# Altium footprint library DIOT_temperature_logger.PcbLib: 100 footprints (part 3 of 7)
Each footprint in its own frame and in the unit in brackets; x right, y up, seen from the top. Pads: shape width x height; smd on the part's side, far side on the other; paste and mask are expansions set on the pad; w line width, h text height; cw(c..) or ccw(c..) is an arc to the next point about the centre after c.
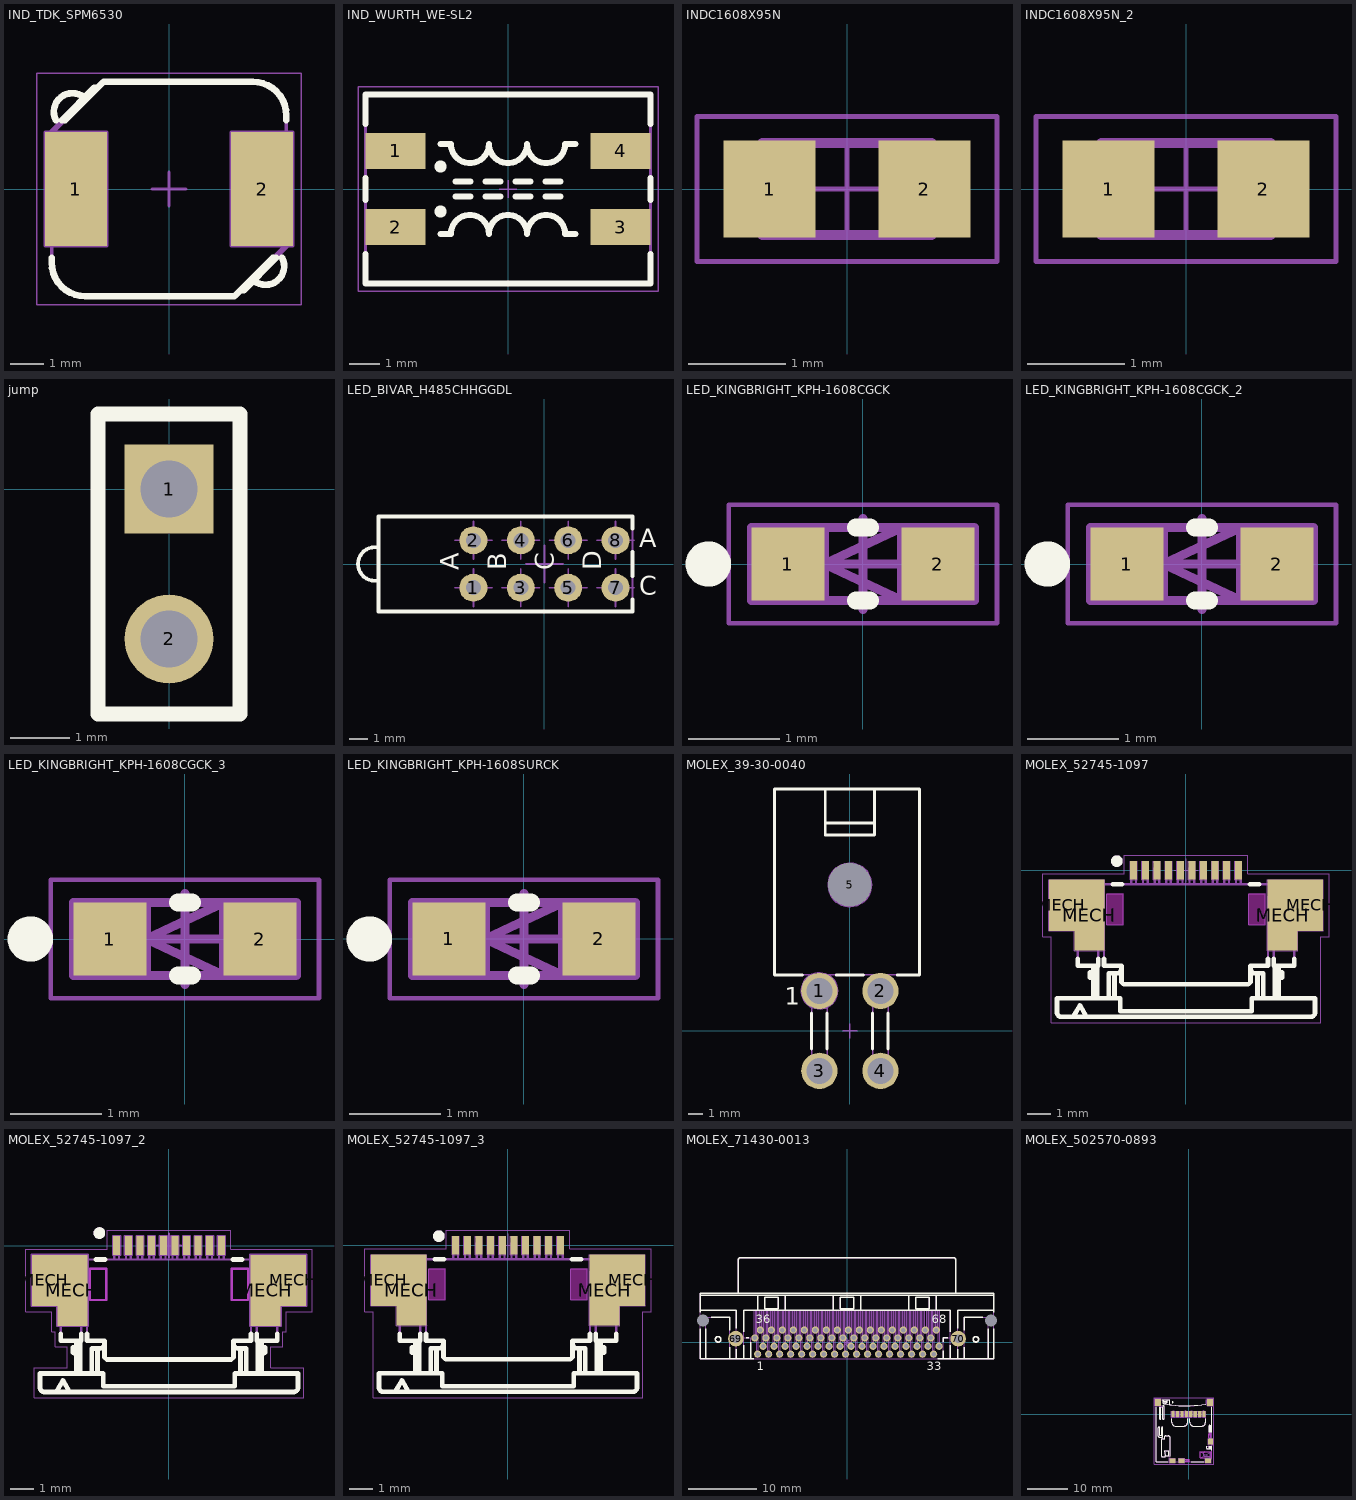
[diagram p2: the footprints below, top view; thin cyan lines are the x and y axes]

## IND_TDK_SPM6530 [mm]
pads (2):
  rect 1.85x3.4 smd: 1(-2.775,0) 2(2.775,0)
Top Overlay:
  lines w0.2: -3.5,-2.05 -3.5,-2.2 ccw(c-2.5,-2.2) -2.5,-3.2 1.95,-3.2 3.1,-2.05 ; -3.373,2.05 cw(c-2.883,2.307) -2.532,2.733 -2.524,2.726 ; -3.2,2.05 -2.227,3.023 -2.127,3.023 ; -3.1,2.05 -1.95,3.2 2.5,3.2 cw(c2.5,2.2) 3.5,2.2 3.5,2.05 ; 2.127,-3.023 2.227,-3.023 3.2,-2.05 ; 2.524,-2.726 2.532,-2.733 ccw(c2.883,-2.307) 3.373,-2.05
Mechanical 8:
  lines w0.1: -3.275,0 -2.775,0 ; -2.775,-0.5 -2.775,0 ; -2.775,0.5 -2.775,0 ; -2.275,0 -2.775,0 ; -0.5,0 0,0 ; 0,-0.5 0,0 ; 0,0.5 0,0 ; 0.5,0 0,0 ; 2.275,0 2.775,0 ; 2.775,-0.5 2.775,0 ; 2.775,0.5 2.775,0 ; 3.275,0 2.775,0 ; -3.7,-1.7 -3.7,1.7 -1.85,1.7 -1.85,-1.7 -3.7,-1.7 ; 1.85,-1.7 3.7,-1.7 3.7,1.7 1.85,1.7 1.85,-1.7
Mechanical 14:
  lines w0.1: -3.5,-1.6 -3.6,-1.6 -3.6,1.65 ; -3.302,1.948 -3.309,1.955 cw(c-2.883,2.307) -2.532,2.733 -2.524,2.726 ; -2.127,3.023 -2.227,3.023 -3.6,1.65 ; 2.127,-3.023 2.227,-3.023 3.6,-1.65 ; 2.524,-2.726 2.532,-2.733 ccw(c2.883,-2.307) 3.309,-1.955 3.302,-1.948 ; 3.5,1.6 3.6,1.6 3.6,-1.65 ; -3.6,1.65 -3.5,1.65 ; -3.5,1.65 -1.95,3.2 2.5,3.2 cw(c2.5,2.2) 3.5,2.2 3.5,0.9 2.564,0.9 2.564,1 ccw(c2.295,1) 2.025,1 2.025,-1 ccw(c2.295,-1) 2.564,-1 2.564,-0.9 3.5,-0.9 3.5,-1.65 ; -3.5,1.65 -3.5,0.9 -2.564,0.9 -2.564,1 cw(c-2.295,1) -2.025,1 -2.025,-1 cw(c-2.295,-1) -2.564,-1 -2.564,-0.9 -3.5,-0.9 -3.5,-2.2 ccw(c-2.5,-2.2) -2.5,-3.2 1.95,-3.2 3.5,-1.65 ; 3.5,-1.65 3.6,-1.65
Mechanical 15:
  lines w0.05: -3.95,-3.45 3.95,-3.45 3.95,3.45 -3.95,3.45 -3.95,-3.45
3D body "IND_TDK_SPM6530.stp": height 3.1, standoff 0, extent -3.6,-3.2 3.6,3.2

## IND_WURTH_WE-SL2 [mm]
pads (4):
  rect 2x1.2 smd: 1(-3.75,1.27) 2(-3.75,-1.27) 3(3.75,-1.27) 4(3.75,1.27)
Top Overlay:
  circle w0.2: c-2.25,0.75 r0.1
  circle w0.2: c-2.25,-0.75 r0.1
  lines w0.2: -4.75,-2.175 -4.75,-3.15 4.75,-3.15 4.75,-2.175 ; -4.75,-0.365 -4.75,0.365 ; -4.75,2.175 -4.75,3.15 4.75,3.15 4.75,2.175 ; -2.25,-1.5 -1.905,-1.5 cw(c-1.27,-1.5) -0.635,-1.5 cw(c0,-1.5) 0.635,-1.5 cw(c1.27,-1.5) 1.905,-1.5 2.25,-1.5 ; -2.25,1.5 -1.905,1.5 ccw(c-1.27,1.5) -0.635,1.5 ccw(c0,1.5) 0.635,1.5 ccw(c1.27,1.5) 1.905,1.5 2.25,1.5 ; -1.75,-0.25 -1.25,-0.25 ; -1.75,0.25 -1.25,0.25 ; -0.75,-0.25 -0.25,-0.25 ; -0.75,0.25 -0.25,0.25 ; 0.25,-0.25 0.75,-0.25 ; 0.25,0.25 0.75,0.25 ; 1.25,-0.25 1.75,-0.25 ; 1.25,0.25 1.75,0.25 ; 4.75,-0.365 4.75,0.365
Mechanical 8:
  lines w0.05: -0.3,0 0.3,0 ; 0,-0.3 0,0.3
Mechanical 14:
  circle w0.1: c-2.25,0.75 r0.1
  circle w0.1: c-2.25,-0.75 r0.1
  lines w0.1: -2.25,-1.5 -1.905,-1.5 cw(c-1.27,-1.5) -0.635,-1.5 cw(c0,-1.5) 0.635,-1.5 cw(c1.27,-1.5) 1.905,-1.5 2.25,-1.5 ; -2.25,1.5 -1.905,1.5 ccw(c-1.27,1.5) -0.635,1.5 ccw(c0,1.5) 0.635,1.5 ccw(c1.27,1.5) 1.905,1.5 2.25,1.5 ; -1.75,-0.25 -1.25,-0.25 ; -1.75,0.25 -1.25,0.25 ; -0.75,-0.25 -0.25,-0.25 ; -0.75,0.25 -0.25,0.25 ; 0.25,-0.25 0.75,-0.25 ; 0.25,0.25 0.75,0.25 ; 1.25,-0.25 1.75,-0.25 ; 1.25,0.25 1.75,0.25 ; -4.75,-3.15 4.75,-3.15 4.75,3.15 -4.75,3.15 -4.75,-3.15
Mechanical 15:
  lines w0.05: -5,-3.4 5,-3.4 5,3.4 -5,3.4 -5,-3.4
3D body "IND_WURTH_WE-SL2.stp": height 5.3, standoff 0, extent -4.749,-3.149 4.751,3.151

## INDC1608X95N [mm]
pads (2):
  rect 0.95x1 smd: 1(-0.8,0) 2(0.8,0)
Mechanical 14:
  lines w0.1: -0.875,-0.475 -0.875,0.475 0.875,0.475 0.875,-0.475 -0.875,-0.475
Mechanical 15:
  lines w0.05: -0.5,0 0.5,0 ; 0,-0.5 0,0.5 ; -1.55,-0.75 -1.55,0.75 1.55,0.75 1.55,-0.75 -1.55,-0.75
3D body "INDC1608X95N.stp": height 0.95, standoff -0.05, extent -0.875,-0.475 0.875,0.475

## INDC1608X95N_2 [mm]
pads (2):
  rect 0.95x1 smd: 1(-0.8,0) 2(0.8,0)
Mechanical 14:
  lines w0.1: -0.875,-0.475 -0.875,0.475 0.875,0.475 0.875,-0.475 -0.875,-0.475
Mechanical 15:
  lines w0.05: -0.5,0 0.5,0 ; 0,-0.5 0,0.5 ; -1.55,-0.75 -1.55,0.75 1.55,0.75 1.55,-0.75 -1.55,-0.75
3D body "INDC1608X95N.stp": height 0.95, standoff -0.05, extent -0.875,-0.475 0.875,0.475

## jump [mm]
pads (2):
  rect 1.5x1.5 hole 0.965: 1(0,0)
  round 1.5 hole 0.965: 2(0,-2.54)
Top Overlay:
  lines w0.254: -1.2,-3.81 -1.2,1.27 1.2,1.27 1.2,-3.81 -1.2,-3.81
3D body "COMATEL_385.0358.1.02.400.stp": height 8, standoff -3.2, extent -1.256,-3.835 1.194,1.245

## LED_BIVAR_H485CHHGGDL [mm]
pads (8):
  round 1.5 hole 0.8: 1(-3.81,-1.27) 2(-3.81,1.27) 3(-1.27,-1.27) 4(-1.27,1.27) 5(1.27,-1.27) 6(1.27,1.27) 7(3.81,-1.27) 8(3.81,1.27)
Top Overlay:
  lines w0.2: -8.89,-0.9 -9.09,-0.9 cw(c-9.09,0) -9.09,0.9 -8.89,0.9 ; 4.71,-1.902 4.71,-2.55 -8.89,-2.55 -8.89,2.55 4.71,2.55 4.71,1.902 ; 4.71,-0.638 4.71,0.638
  text "A" at -4.591,-0.331 h1
  text "B" at -2.051,-0.331 h1
  text "C" at 0.489,-0.331 h1
  text "D" at 3.029,-0.331 h1
  text "A" at 5.08,0.889 h1
  text "C" at 5.08,-1.651 h1
Mechanical 8:
  lines w0.1: -4.81,-1.27 -3.81,-1.27 ; -4.81,1.27 -3.81,1.27 ; -3.81,-2.27 -3.81,-1.27 ; -3.81,-0.27 -3.81,-1.27 ; -3.81,0.27 -3.81,1.27 ; -3.81,2.27 -3.81,1.27 ; -2.81,-1.27 -3.81,-1.27 ; -2.81,1.27 -3.81,1.27 ; -2.27,-1.27 -1.27,-1.27 ; -2.27,1.27 -1.27,1.27 ; -1.27,-2.27 -1.27,-1.27 ; -1.27,-0.27 -1.27,-1.27 ; -1.27,0.27 -1.27,1.27 ; -1.27,2.27 -1.27,1.27 ; -1,0 0,0 ; -0.27,-1.27 -1.27,-1.27 ; -0.27,1.27 -1.27,1.27 ; 0,-1 0,0 ; 0,1 0,0 ; 0.27,-1.27 1.27,-1.27 ; 0.27,1.27 1.27,1.27 ; 1,0 0,0 ; 1.27,-2.27 1.27,-1.27 ; 1.27,-0.27 1.27,-1.27 ; 1.27,0.27 1.27,1.27 ; 1.27,2.27 1.27,1.27 ; 2.27,-1.27 1.27,-1.27 ; 2.27,1.27 1.27,1.27 ; 2.81,-1.27 3.81,-1.27 ; 2.81,1.27 3.81,1.27 ; 3.81,-2.27 3.81,-1.27 ; 3.81,-0.27 3.81,-1.27 ; 3.81,0.27 3.81,1.27 ; 3.81,2.27 3.81,1.27 ; 4.81,-1.27 3.81,-1.27 ; 4.81,1.27 3.81,1.27
Mechanical 14:
  lines w0.1: -8.89,-0.9 -9.09,-0.9 cw(c-9.09,0) -9.09,0.9 -8.89,0.9 ; -8.89,-2.55 -8.89,2.55 4.71,2.55 4.71,-2.55 -8.89,-2.55
  text "A" at -4.591,-0.331 h1
  text "B" at -2.051,-0.331 h1
  text "C" at 0.489,-0.331 h1
  text "D" at 3.029,-0.331 h1
  text "C" at 5.08,-1.651 h1
  text "A" at 5.08,0.889 h1
3D body "LED_BIVAR_H485CHHGGDL.stp": height 11.3, standoff -3.2, extent -9.99,-2.55 4.71,2.55

## LED_KINGBRIGHT_KPH-1608CGCK [mm]
pads (2):
  rect 0.8x0.8 smd: 1(-0.825,0) 2(0.825,0)
Top Overlay:
  circle w0.25: c-1.7,0 r0.125
  lines w0.2: -0.075,-0.4 0.075,-0.4 ; -0.075,0.4 0.075,0.4
Mechanical 8:
  lines w0.1: -0.5,0 0,0 ; -0.425,0 0.425,0 ; 0,-0.5 0,0 ; 0,0.5 0,0 ; 0.5,0 0,0 ; -0.425,-0.4 -1.225,-0.4 -1.225,0.4 -0.425,0.4 ; -0.425,-0.4 -0.425,0.4 ; -0.425,-0.4 -0.825,0 -0.425,0.4 ; 1.225,-0.4 0.425,-0.4 0.425,0.4 1.225,0.4 ; 1.225,-0.4 1.225,0.4 ; 1.225,-0.4 0.825,0 1.225,0.4
Mechanical 14:
  lines w0.1: -0.8,-0.4 -0.8,0.4 0.8,0.4 0.8,-0.4 -0.8,-0.4 ; -0.425,0 0.425,0.4 0.425,-0.4 -0.425,0
Mechanical 15:
  lines w0.05: -1.475,-0.65 -1.475,0.65 1.475,0.65 1.475,-0.65 -1.475,-0.65
3D body "LED_KINGBRIGHT_KPH-1608CGCK_Part1.stp": height 0.2, standoff 0, extent -0.8,-0.4 0.8,0.4
3D body "LED_KINGBRIGHT_KPH-1608CGCK_Part2.stp": height 0.65, standoff 0.12, extent -0.6,-0.4 0.6,0.4

## LED_KINGBRIGHT_KPH-1608CGCK_2 [mm]
pads (2):
  rect 0.8x0.8 smd: 1(-0.825,0) 2(0.825,0)
Top Overlay:
  circle w0.25: c-1.7,0 r0.125
  lines w0.2: -0.075,-0.4 0.075,-0.4 ; -0.075,0.4 0.075,0.4
Mechanical 8:
  lines w0.1: -0.5,0 0,0 ; -0.425,0 0.425,0 ; 0,-0.5 0,0 ; 0,0.5 0,0 ; 0.5,0 0,0 ; -0.425,-0.4 -0.825,0 -0.425,0.4 ; -0.425,-0.4 -0.425,0.4 ; -0.425,-0.4 -1.225,-0.4 -1.225,0.4 -0.425,0.4 ; 1.225,-0.4 0.825,0 1.225,0.4 ; 1.225,-0.4 1.225,0.4 ; 1.225,-0.4 0.425,-0.4 0.425,0.4 1.225,0.4
Mechanical 14:
  lines w0.1: -0.8,-0.4 0.8,-0.4 0.8,0.4 -0.8,0.4 -0.8,-0.4 ; -0.425,0 0.425,-0.4 0.425,0.4 -0.425,0
Mechanical 15:
  lines w0.05: -1.475,-0.65 1.475,-0.65 1.475,0.65 -1.475,0.65 -1.475,-0.65
3D body "LED_KINGBRIGHT_KPH-1608CGCK_Part2.stp": height 0.65, standoff 0.12, extent -0.6,-0.4 0.6,0.4
3D body "LED_KINGBRIGHT_KPH-1608CGCK_Part1.stp": height 0.2, standoff 0, extent -0.8,-0.4 0.8,0.4

## LED_KINGBRIGHT_KPH-1608CGCK_3 [mm]
pads (2):
  rect 0.8x0.8 smd: 1(-0.825,0) 2(0.825,0)
Top Overlay:
  circle w0.25: c-1.7,0 r0.125
  lines w0.2: -0.075,-0.4 0.075,-0.4 ; -0.075,0.4 0.075,0.4
Mechanical 8:
  lines w0.1: -0.5,0 0,0 ; -0.425,0 0.425,0 ; 0,-0.5 0,0 ; 0,0.5 0,0 ; 0.5,0 0,0 ; -0.425,-0.4 -1.225,-0.4 -1.225,0.4 -0.425,0.4 ; -0.425,-0.4 -0.425,0.4 ; -0.425,-0.4 -0.825,0 -0.425,0.4 ; 1.225,-0.4 0.425,-0.4 0.425,0.4 1.225,0.4 ; 1.225,-0.4 1.225,0.4 ; 1.225,-0.4 0.825,0 1.225,0.4
Mechanical 14:
  lines w0.1: -0.8,-0.4 -0.8,0.4 0.8,0.4 0.8,-0.4 -0.8,-0.4 ; -0.425,0 0.425,0.4 0.425,-0.4 -0.425,0
Mechanical 15:
  lines w0.05: -1.475,-0.65 -1.475,0.65 1.475,0.65 1.475,-0.65 -1.475,-0.65
3D body "LED_KINGBRIGHT_KPH-1608CGCK_Part1.stp": height 0.2, standoff 0, extent -0.8,-0.4 0.8,0.4
3D body "LED_KINGBRIGHT_KPH-1608CGCK_Part2.stp": height 0.65, standoff 0.12, extent -0.6,-0.4 0.6,0.4

## LED_KINGBRIGHT_KPH-1608SURCK [mm]
pads (2):
  rect 0.8x0.8 smd: 1(-0.825,0) 2(0.825,0)
Top Overlay:
  circle w0.25: c-1.7,0 r0.125
  lines w0.2: -0.075,-0.4 0.075,-0.4 ; -0.075,0.4 0.075,0.4
Mechanical 8:
  lines w0.1: -0.5,0 0,0 ; -0.425,0 0.425,0 ; 0,-0.5 0,0 ; 0,0.5 0,0 ; 0.5,0 0,0 ; -0.425,-0.4 -1.225,-0.4 -1.225,0.4 -0.425,0.4 ; -0.425,-0.4 -0.425,0.4 ; -0.425,-0.4 -0.825,0 -0.425,0.4 ; 1.225,-0.4 0.425,-0.4 0.425,0.4 1.225,0.4 ; 1.225,-0.4 1.225,0.4 ; 1.225,-0.4 0.825,0 1.225,0.4
Mechanical 14:
  lines w0.1: -0.8,-0.4 -0.8,0.4 0.8,0.4 0.8,-0.4 -0.8,-0.4 ; -0.425,0 0.425,0.4 0.425,-0.4 -0.425,0
Mechanical 15:
  lines w0.05: -1.475,-0.65 -1.475,0.65 1.475,0.65 1.475,-0.65 -1.475,-0.65
3D body "LED_KINGBRIGHT_KPH-1608SURCK_Part2.stp": height 0.65, standoff 0.12, extent -0.6,-0.4 0.6,0.4
3D body "LED_KINGBRIGHT_KPH-1608SURCK_Part1.stp": height 0.2, standoff 0, extent -0.8,-0.4 0.8,0.4

## MOLEX_39-30-0040 [mm]
pads (5):
  round 2.5 hole 1.8: 1(-2.1,2.75) 2(2.1,2.75) 3(-2.1,-2.75) 4(2.1,-2.75)
  round 1 hole 3 unplated mask+1: 5(0,10.05)
Top Overlay:
  lines w0.2: -3.262,3.85 -5.2,3.85 -5.2,16.65 4.8,16.65 4.8,3.85 3.262,3.85 ; -2.635,-1.242 -2.635,1.242 ; -1.7,14.3 1.7,14.3 ; -1.7,16.65 -1.7,13.478 1.7,13.478 1.7,16.65 ; -1.565,-1.242 -1.565,1.242 ; -0.938,3.85 0.938,3.85 ; 1.565,-1.242 1.565,1.242 ; 2.635,-1.242 2.635,1.242
  text "1" at -4.475,1.8 h1.2
Mechanical 8:
  circle w0.1: c0,10.05 r1.5
  circle w0.1: c-2.1,2.75 r0.9
  circle w0.1: c-2.1,2.75 r1.25
  lines w0.1: -2.6,-2.75 -2.1,-2.75 ; -2.6,2.75 -2.1,2.75 ; -2.1,-3.25 -2.1,-2.75 ; -2.1,-2.25 -2.1,-2.75 ; -2.1,2.25 -2.1,2.75 ; -2.1,3.25 -2.1,2.75 ; -1.6,-2.75 -2.1,-2.75 ; -1.6,2.75 -2.1,2.75 ; -0.5,0 0,0 ; -0.5,10.05 0,10.05 ; 0,-0.5 0,0 ; 0,0.5 0,0 ; 0,9.55 0,10.05 ; 0,10.55 0,10.05 ; 0.5,0 0,0 ; 0.5,10.05 0,10.05 ; 1.6,-2.75 2.1,-2.75 ; 1.6,2.75 2.1,2.75 ; 2.1,-3.25 2.1,-2.75 ; 2.1,-2.25 2.1,-2.75 ; 2.1,2.25 2.1,2.75 ; 2.1,3.25 2.1,2.75 ; 2.6,-2.75 2.1,-2.75 ; 2.6,2.75 2.1,2.75
Mechanical 14:
  lines w0.1: -2.635,3.85 -2.635,-3.285 -1.565,-3.285 -1.565,3.85 ; -1.7,14.3 1.7,14.3 ; -1.7,16.65 -1.7,13.478 1.7,13.478 1.7,16.65 ; 1.565,3.85 1.565,-3.285 2.635,-3.285 2.635,3.85 ; -5.2,3.85 4.8,3.85 4.8,16.65 -5.2,16.65 -5.2,3.85
  text "1" at -4.475,1.8 h1.2
3D body "MOLEX_39-30-0040.stp": height 11.4, standoff -3.6, extent -5.2,-3.285 4.8,16.65

## MOLEX_52745-1097 [mm]
pads (14):
  rect 0.3x0.8 smd: 1(-2.25,0) 2(-1.75,0) 3(-1.25,0) 4(-0.75,0) 5(-0.24,0) 6(0.25,0) 7(0.75,0) 8(1.25,0) 9(1.75,0) 10(2.25,0)
  rect 1.1x2.2 smd: MECH(-5.35,-1.5) MECH(5.35,-1.5)
  rect 1.3x3.05 smd: MECH(-4.15,-1.925) MECH(4.15,-1.925)
Top Layer keep-out:
  region: -3.4,-1 -2.7,-1 -2.7,-2.34 -3.4,-2.34
  region: 2.7,-1 3.4,-1 3.4,-2.34 2.7,-2.34
Top Overlay:
  circle w0.25: c-2.975,0.4 r0.125
  lines w0.2: -4.85,-6.3 -4.564,-5.8 -4.275,-6.3 ; -4.65,-3.8 -4.65,-4.1 -3.775,-4.1 -3.775,-3.8 ; -3.975,-5.5 -3.975,-4.1 ; -3.975,-4.7 -4.125,-4.613 -4.125,-4.387 -3.975,-4.3 ; -3.815,-5.5 -3.815,-4.1 ; -3.525,-3.8 -3.525,-4.1 -2.775,-4.1 -2.775,-4.8 -2.675,-4.9 2.675,-4.9 2.775,-4.8 2.775,-4.1 3.525,-4.1 3.525,-3.8 ; -3.325,-5.5 -3.325,-4.426 -3.075,-4.426 ; -3.15,-0.6 -2.75,-0.6 ; -3.075,-5.5 -3.075,-4.426 ; -2.775,-4.216 cw(c-2.985,-4.216) -2.985,-4.426 -3.075,-4.426 ; 2.75,-0.6 3.15,-0.6 ; 2.775,-4.216 ccw(c2.985,-4.216) 2.985,-4.426 3.325,-4.426 3.325,-5.5 ; 3.075,-5.5 3.075,-4.426 ; 3.775,-3.8 3.775,-4.1 4.65,-4.1 4.65,-3.8 ; 3.815,-5.5 3.815,-4.1 ; 3.975,-5.5 3.975,-4.1 ; 3.975,-4.7 4.125,-4.613 4.125,-4.387 3.975,-4.3 ; -5.55,-6.1 ccw(c-5.35,-6.1) -5.35,-6.3 5.35,-6.3 ccw(c5.35,-6.1) 5.55,-6.1 5.55,-5.5 2.825,-5.5 2.825,-6.05 -2.825,-6.05 -2.825,-5.5 -5.55,-5.5 -5.55,-6.1
Mechanical 8:
  lines w0.05: -4.8,-0.4 -4.15,-1.925 -3.5,-0.4 ; -0.5,0 0,0 ; 0,-0.5 0,0 ; 0,0.5 0,0 ; 0.5,0 0,0 ; 4.8,-0.4 4.15,-1.925 3.5,-0.4 ; -5.9,-2.6 -4.8,-2.6 ; -5.9,-2.6 -5.9,-0.4 ; -5.9,-2.6 -5.35,-1.5 -4.8,-2.6 ; -5.9,-0.4 -3.5,-0.4 ; -5.9,-0.4 -4.7,-1.925 -3.5,-3.45 ; -4.8,-2.6 -4.8,-3.45 -3.5,-3.45 ; -3.5,-3.45 -3.5,-0.4 ; -2.4,0.4 -2.25,0 -2.1,0.4 ; -2.4,0.4 -2.4,-0.4 -2.1,-0.4 -2.1,0.4 ; -2.4,0.4 -2.1,0.4 ; -1.9,0.4 -1.75,0 -1.6,0.4 ; -1.9,0.4 -1.9,-0.4 -1.6,-0.4 -1.6,0.4 ; -1.9,0.4 -1.6,0.4 ; -1.4,0.4 -1.25,0 -1.1,0.4 ; -1.4,0.4 -1.4,-0.4 -1.1,-0.4 -1.1,0.4 ; -1.4,0.4 -1.1,0.4 ; -0.9,0.4 -0.75,0 -0.6,0.4 ; -0.9,0.4 -0.9,-0.4 -0.6,-0.4 -0.6,0.4 ; -0.9,0.4 -0.6,0.4 ; -0.4,0.4 -0.25,0 -0.1,0.4 ; -0.4,0.4 -0.4,-0.4 -0.1,-0.4 -0.1,0.4 ; -0.4,0.4 -0.1,0.4 ; 0.1,0.4 0.25,0 0.4,0.4 ; 0.1,0.4 0.1,-0.4 0.4,-0.4 0.4,0.4 ; 0.1,0.4 0.4,0.4 ; 0.6,0.4 0.75,0 0.9,0.4 ; 0.6,0.4 0.6,-0.4 0.9,-0.4 0.9,0.4 ; 0.6,0.4 0.9,0.4 ; 1.1,0.4 1.25,0 1.4,0.4 ; 1.1,0.4 1.1,-0.4 1.4,-0.4 1.4,0.4 ; 1.1,0.4 1.4,0.4 ; 1.6,0.4 1.75,0 1.9,0.4 ; 1.6,0.4 1.6,-0.4 1.9,-0.4 1.9,0.4 ; 1.6,0.4 1.9,0.4 ; 2.1,0.4 2.25,0 2.4,0.4 ; 2.1,0.4 2.1,-0.4 2.4,-0.4 2.4,0.4 ; 2.1,0.4 2.4,0.4 ; 3.5,-3.45 3.5,-0.4 ; 3.5,-3.45 4.8,-3.45 4.8,-2.6 ; 3.5,-3.45 4.7,-1.925 5.9,-0.4 ; 3.5,-0.4 5.9,-0.4 ; 4.8,-2.6 5.9,-2.6 ; 4.8,-2.6 5.35,-1.5 5.9,-2.6 ; 5.9,-2.6 5.9,-0.4 ; -3.4,-2.34 -3.4,-1 -2.7,-1 -2.7,-2.34 -3.4,-2.34 ; 2.7,-2.34 2.7,-1 3.4,-1 3.4,-2.34 2.7,-2.34
Mechanical 14:
  circle w0.25: c-2.975,0.4 r0.125
  lines w0.1: -4.85,-6.3 -4.564,-5.8 -4.275,-6.3 ; -4.65,-1.8 -5.35,-1.8 -5.35,-1.6 -4.85,-1.6 -4.85,-1.3 -5.35,-1.3 -5.35,-1.1 -4.85,-1.1 -4.85,-0.9 -4.65,-0.9 ; -3.975,-5.5 -3.975,-4.1 ; -3.975,-4.7 -4.125,-4.613 -4.125,-4.387 -3.975,-4.3 ; -3.815,-5.5 -3.815,-4.1 ; -3.325,-5.5 -3.325,-4.426 -3.075,-4.426 ; -3.075,-5.5 -3.075,-4.426 ; -2.775,-4.216 cw(c-2.985,-4.216) -2.985,-4.426 -3.075,-4.426 ; -2.35,-0.593 -2.35,0.1 -2.15,0.1 -2.15,-0.593 ; -1.85,-0.593 -1.85,0.1 -1.65,0.1 -1.65,-0.593 ; -1.35,-0.593 -1.35,0.1 -1.15,0.1 -1.15,-0.593 ; -0.85,-0.593 -0.85,0.1 -0.65,0.1 -0.65,-0.593 ; -0.35,-0.593 -0.35,0.1 -0.15,0.1 -0.15,-0.593 ; 0.15,-0.593 0.15,0.1 0.35,0.1 0.35,-0.593 ; 0.65,-0.593 0.65,0.1 0.85,0.1 0.85,-0.593 ; 1.15,-0.593 1.15,0.1 1.35,0.1 1.35,-0.593 ; 1.65,-0.593 1.65,0.1 1.85,0.1 1.85,-0.593 ; 2.15,-0.593 2.15,0.1 2.35,0.1 2.35,-0.593 ; 2.775,-4.216 ccw(c2.985,-4.216) 2.985,-4.426 3.325,-4.426 3.325,-5.5 ; 3.075,-5.5 3.075,-4.426 ; 3.815,-5.5 3.815,-4.1 ; 3.975,-5.5 3.975,-4.1 ; 3.975,-4.7 4.125,-4.613 4.125,-4.387 3.975,-4.3 ; 4.65,-1.8 5.35,-1.8 5.35,-1.6 4.85,-1.6 4.85,-1.3 5.35,-1.3 5.35,-1.1 4.85,-1.1 4.85,-0.9 4.65,-0.9 ; -5.55,-6.1 ccw(c-5.35,-6.1) -5.35,-6.3 5.35,-6.3 ccw(c5.35,-6.1) 5.55,-6.1 5.55,-5.5 2.825,-5.5 2.825,-6.05 -2.825,-6.05 -2.825,-5.5 -5.55,-5.5 -5.55,-6.1 ; -4.65,-4.1 -3.775,-4.1 -3.775,-1.225 cw(c-3.65,-1.225) -3.525,-1.225 -3.525,-4.1 -2.775,-4.1 -2.775,-4.8 -2.675,-4.9 2.675,-4.9 2.775,-4.8 2.775,-4.1 3.525,-4.1 3.525,-1.225 cw(c3.65,-1.225) 3.775,-1.225 3.775,-4.1 4.65,-4.1 4.65,-0.6 -4.65,-0.6 -4.65,-4.1
Mechanical 15:
  lines w0.05: -6.15,-2.85 -5.8,-2.85 -5.8,-6.55 5.8,-6.55 5.8,-2.85 6.15,-2.85 6.15,-0.15 2.65,-0.15 2.65,0.65 -2.65,0.65 -2.65,-0.15 -6.15,-0.15 -6.15,-2.85
3D body "MOLEX_52745-1097.stp": height 2, standoff 0, extent -5.55,-6.3 5.55,0.1

## MOLEX_52745-1097_2 [mm]
pads (14):
  rect 0.3x0.8 smd: 1(-2.25,0) 2(-1.75,0) 3(-1.25,0) 4(-0.75,0) 5(-0.24,0) 6(0.25,0) 7(0.75,0) 8(1.25,0) 9(1.75,0) 10(2.25,0)
  rect 1.1x2.2 smd: MECH(-5.35,-1.5) MECH(5.35,-1.5)
  rect 1.3x3.05 smd: MECH(-4.15,-1.925) MECH(4.15,-1.925)
Top Layer keep-out:
  lines w0.1: -3.4,-2.34 -2.7,-2.34 -2.7,-1 -3.4,-1 -3.4,-2.34 ; 2.7,-2.34 2.7,-1 3.4,-1 3.4,-2.34 2.7,-2.34
Top Overlay:
  circle w0.25: c-2.994,0.536 r0.125
  lines w0.2: -4.85,-6.3 -4.564,-5.8 -4.275,-6.3 ; -4.65,-3.8 -4.65,-4.1 -3.775,-4.1 -3.775,-3.8 ; -3.975,-5.5 -3.975,-4.1 ; -3.975,-4.7 -4.125,-4.613 -4.125,-4.387 -3.975,-4.3 ; -3.815,-5.5 -3.815,-4.1 ; -3.525,-3.8 -3.525,-4.1 -2.775,-4.1 -2.775,-4.8 -2.675,-4.9 2.675,-4.9 2.775,-4.8 2.775,-4.1 3.525,-4.1 3.525,-3.8 ; -3.325,-5.5 -3.325,-4.426 -3.075,-4.426 ; -3.15,-0.6 -2.75,-0.6 ; -3.075,-5.5 -3.075,-4.426 ; -2.775,-4.216 cw(c-2.985,-4.216) -2.985,-4.426 -3.075,-4.426 ; 2.75,-0.6 3.15,-0.6 ; 2.775,-4.216 ccw(c2.985,-4.216) 2.985,-4.426 3.325,-4.426 3.325,-5.5 ; 3.075,-5.5 3.075,-4.426 ; 3.775,-3.8 3.775,-4.1 4.65,-4.1 4.65,-3.8 ; 3.815,-5.5 3.815,-4.1 ; 3.975,-5.5 3.975,-4.1 ; 3.975,-4.7 4.125,-4.613 4.125,-4.387 3.975,-4.3 ; -5.55,-6.1 ccw(c-5.35,-6.1) -5.35,-6.3 5.35,-6.3 ccw(c5.35,-6.1) 5.55,-6.1 5.55,-5.5 2.825,-5.5 2.825,-6.05 -2.825,-6.05 -2.825,-5.5 -5.55,-5.5 -5.55,-6.1
Mechanical 8:
  lines w0.1: -4.8,-0.4 -4.15,-1.925 -3.5,-0.4 ; -0.5,0 0,0 ; 0,-0.5 0,0 ; 0,0.5 0,0 ; 0.5,0 0,0 ; 4.8,-0.4 4.15,-1.925 3.5,-0.4 ; -5.9,-2.6 -5.35,-1.5 -4.8,-2.6 ; -5.9,-2.6 -5.9,-0.4 ; -5.9,-2.6 -4.8,-2.6 ; -5.9,-0.4 -4.7,-1.925 -3.5,-3.45 ; -5.9,-0.4 -3.5,-0.4 ; -4.8,-2.6 -4.8,-3.45 -3.5,-3.45 ; -3.5,-3.45 -3.5,-0.4 ; -2.4,0.4 -2.1,0.4 ; -2.4,0.4 -2.4,-0.4 -2.1,-0.4 -2.1,0.4 ; -2.4,0.4 -2.25,0 -2.1,0.4 ; -1.9,0.4 -1.6,0.4 ; -1.9,0.4 -1.9,-0.4 -1.6,-0.4 -1.6,0.4 ; -1.9,0.4 -1.75,0 -1.6,0.4 ; -1.4,0.4 -1.1,0.4 ; -1.4,0.4 -1.4,-0.4 -1.1,-0.4 -1.1,0.4 ; -1.4,0.4 -1.25,0 -1.1,0.4 ; -0.9,0.4 -0.6,0.4 ; -0.9,0.4 -0.9,-0.4 -0.6,-0.4 -0.6,0.4 ; -0.9,0.4 -0.75,0 -0.6,0.4 ; -0.4,0.4 -0.1,0.4 ; -0.4,0.4 -0.4,-0.4 -0.1,-0.4 -0.1,0.4 ; -0.4,0.4 -0.25,0 -0.1,0.4 ; 0.1,0.4 0.4,0.4 ; 0.1,0.4 0.1,-0.4 0.4,-0.4 0.4,0.4 ; 0.1,0.4 0.25,0 0.4,0.4 ; 0.6,0.4 0.9,0.4 ; 0.6,0.4 0.6,-0.4 0.9,-0.4 0.9,0.4 ; 0.6,0.4 0.75,0 0.9,0.4 ; 1.1,0.4 1.4,0.4 ; 1.1,0.4 1.1,-0.4 1.4,-0.4 1.4,0.4 ; 1.1,0.4 1.25,0 1.4,0.4 ; 1.6,0.4 1.9,0.4 ; 1.6,0.4 1.6,-0.4 1.9,-0.4 1.9,0.4 ; 1.6,0.4 1.75,0 1.9,0.4 ; 2.1,0.4 2.4,0.4 ; 2.1,0.4 2.1,-0.4 2.4,-0.4 2.4,0.4 ; 2.1,0.4 2.25,0 2.4,0.4 ; 3.5,-3.45 4.7,-1.925 5.9,-0.4 ; 3.5,-3.45 4.8,-3.45 4.8,-2.6 ; 3.5,-3.45 3.5,-0.4 ; 3.5,-0.4 5.9,-0.4 ; 4.8,-2.6 5.35,-1.5 5.9,-2.6 ; 4.8,-2.6 5.9,-2.6 ; 5.9,-2.6 5.9,-0.4 ; -3.4,-2.34 -2.7,-2.34 -2.7,-1 -3.4,-1 -3.4,-2.34 ; 2.7,-2.34 3.4,-2.34 3.4,-1 2.7,-1 2.7,-2.34
Mechanical 14:
  circle w0.25: c-2.994,0.536 r0.125
  lines w0.1: -4.85,-6.3 -4.564,-5.8 -4.275,-6.3 ; -4.65,-1.8 -5.35,-1.8 -5.35,-1.6 -4.85,-1.6 -4.85,-1.3 -5.35,-1.3 -5.35,-1.1 -4.85,-1.1 -4.85,-0.9 -4.65,-0.9 ; -3.975,-5.5 -3.975,-4.1 ; -3.975,-4.7 -4.125,-4.613 -4.125,-4.387 -3.975,-4.3 ; -3.815,-5.5 -3.815,-4.1 ; -3.325,-5.5 -3.325,-4.426 -3.075,-4.426 ; -3.075,-5.5 -3.075,-4.426 ; -2.775,-4.216 cw(c-2.985,-4.216) -2.985,-4.426 -3.075,-4.426 ; -2.35,-0.593 -2.35,0.1 -2.15,0.1 -2.15,-0.593 ; -1.85,-0.593 -1.85,0.1 -1.65,0.1 -1.65,-0.593 ; -1.35,-0.593 -1.35,0.1 -1.15,0.1 -1.15,-0.593 ; -0.85,-0.593 -0.85,0.1 -0.65,0.1 -0.65,-0.593 ; -0.35,-0.593 -0.35,0.1 -0.15,0.1 -0.15,-0.593 ; 0.15,-0.593 0.15,0.1 0.35,0.1 0.35,-0.593 ; 0.65,-0.593 0.65,0.1 0.85,0.1 0.85,-0.593 ; 1.15,-0.593 1.15,0.1 1.35,0.1 1.35,-0.593 ; 1.65,-0.593 1.65,0.1 1.85,0.1 1.85,-0.593 ; 2.15,-0.593 2.15,0.1 2.35,0.1 2.35,-0.593 ; 2.775,-4.216 ccw(c2.985,-4.216) 2.985,-4.426 3.325,-4.426 3.325,-5.5 ; 3.075,-5.5 3.075,-4.426 ; 3.815,-5.5 3.815,-4.1 ; 3.975,-5.5 3.975,-4.1 ; 3.975,-4.7 4.125,-4.613 4.125,-4.387 3.975,-4.3 ; 4.65,-1.8 5.35,-1.8 5.35,-1.6 4.85,-1.6 4.85,-1.3 5.35,-1.3 5.35,-1.1 4.85,-1.1 4.85,-0.9 4.65,-0.9 ; -5.55,-6.1 ccw(c-5.35,-6.1) -5.35,-6.3 5.35,-6.3 ccw(c5.35,-6.1) 5.55,-6.1 5.55,-5.5 2.825,-5.5 2.825,-6.05 -2.825,-6.05 -2.825,-5.5 -5.55,-5.5 -5.55,-6.1 ; -4.65,-4.1 -4.65,-0.6 4.65,-0.6 4.65,-4.1 3.775,-4.1 3.775,-1.225 ccw(c3.65,-1.225) 3.525,-1.225 3.525,-4.1 2.775,-4.1 2.775,-4.8 2.675,-4.9 -2.675,-4.9 -2.775,-4.8 -2.775,-4.1 -3.525,-4.1 -3.525,-1.225 ccw(c-3.65,-1.225) -3.775,-1.225 -3.775,-4.1 -4.65,-4.1
Mechanical 15:
  lines w0.05: -6.15,-2.85 -6.15,-0.15 -2.65,-0.15 -2.65,0.65 2.65,0.65 2.65,-0.15 6.15,-0.15 6.15,-2.85 5.05,-2.85 5.05,-3.7 4.9,-3.7 4.9,-4.35 4.375,-4.35 4.375,-5.25 5.8,-5.25 5.8,-6.55 -5.8,-6.55 -5.8,-5.25 -4.375,-5.25 -4.375,-4.35 -4.9,-4.35 -4.9,-3.7 -5.05,-3.7 -5.05,-2.85 -6.15,-2.85
3D body "MOLEX_52745-1097.stp": height 2, standoff 0, extent -5.55,-6.3 5.55,0.1

## MOLEX_52745-1097_3 [mm]
pads (14):
  rect 0.3x0.8 smd: 1(-2.25,0) 2(-1.75,0) 3(-1.25,0) 4(-0.75,0) 5(-0.24,0) 6(0.25,0) 7(0.75,0) 8(1.25,0) 9(1.75,0) 10(2.25,0)
  rect 1.1x2.2 smd: MECH(-5.35,-1.5) MECH(5.35,-1.5)
  rect 1.3x3.05 smd: MECH(-4.15,-1.925) MECH(4.15,-1.925)
Top Layer keep-out:
  region: 2.7,-1 3.4,-1 3.4,-2.34 2.7,-2.34
  region: -3.4,-1 -2.7,-1 -2.7,-2.34 -3.4,-2.34
Top Overlay:
  circle w0.25: c-2.975,0.4 r0.125
  lines w0.2: -4.85,-6.3 -4.564,-5.8 -4.275,-6.3 ; -4.65,-3.8 -4.65,-4.1 -3.775,-4.1 -3.775,-3.8 ; -3.975,-5.5 -3.975,-4.1 ; -3.975,-4.7 -4.125,-4.613 -4.125,-4.387 -3.975,-4.3 ; -3.815,-5.5 -3.815,-4.1 ; -3.525,-3.8 -3.525,-4.1 -2.775,-4.1 -2.775,-4.8 -2.675,-4.9 2.675,-4.9 2.775,-4.8 2.775,-4.1 3.525,-4.1 3.525,-3.8 ; -3.325,-5.5 -3.325,-4.426 -3.075,-4.426 ; -3.15,-0.6 -2.75,-0.6 ; -3.075,-5.5 -3.075,-4.426 ; -2.775,-4.216 cw(c-2.985,-4.216) -2.985,-4.426 -3.075,-4.426 ; 2.75,-0.6 3.15,-0.6 ; 2.775,-4.216 ccw(c2.985,-4.216) 2.985,-4.426 3.325,-4.426 3.325,-5.5 ; 3.075,-5.5 3.075,-4.426 ; 3.775,-3.8 3.775,-4.1 4.65,-4.1 4.65,-3.8 ; 3.815,-5.5 3.815,-4.1 ; 3.975,-5.5 3.975,-4.1 ; 3.975,-4.7 4.125,-4.613 4.125,-4.387 3.975,-4.3 ; -5.55,-6.1 ccw(c-5.35,-6.1) -5.35,-6.3 5.35,-6.3 ccw(c5.35,-6.1) 5.55,-6.1 5.55,-5.5 2.825,-5.5 2.825,-6.05 -2.825,-6.05 -2.825,-5.5 -5.55,-5.5 -5.55,-6.1
Mechanical 8:
  lines w0.05: -4.8,-0.4 -4.15,-1.925 -3.5,-0.4 ; -0.5,0 0,0 ; 0,-0.5 0,0 ; 0,0.5 0,0 ; 0.5,0 0,0 ; 4.8,-0.4 4.15,-1.925 3.5,-0.4 ; -5.9,-2.6 -5.35,-1.5 -4.8,-2.6 ; -5.9,-2.6 -5.9,-0.4 ; -5.9,-2.6 -4.8,-2.6 ; -5.9,-0.4 -4.7,-1.925 -3.5,-3.45 ; -5.9,-0.4 -3.5,-0.4 ; -4.8,-2.6 -4.8,-3.45 -3.5,-3.45 ; -3.5,-3.45 -3.5,-0.4 ; -2.4,0.4 -2.1,0.4 ; -2.4,0.4 -2.4,-0.4 -2.1,-0.4 -2.1,0.4 ; -2.4,0.4 -2.25,0 -2.1,0.4 ; -1.9,0.4 -1.6,0.4 ; -1.9,0.4 -1.9,-0.4 -1.6,-0.4 -1.6,0.4 ; -1.9,0.4 -1.75,0 -1.6,0.4 ; -1.4,0.4 -1.1,0.4 ; -1.4,0.4 -1.4,-0.4 -1.1,-0.4 -1.1,0.4 ; -1.4,0.4 -1.25,0 -1.1,0.4 ; -0.9,0.4 -0.6,0.4 ; -0.9,0.4 -0.9,-0.4 -0.6,-0.4 -0.6,0.4 ; -0.9,0.4 -0.75,0 -0.6,0.4 ; -0.4,0.4 -0.1,0.4 ; -0.4,0.4 -0.4,-0.4 -0.1,-0.4 -0.1,0.4 ; -0.4,0.4 -0.25,0 -0.1,0.4 ; 0.1,0.4 0.4,0.4 ; 0.1,0.4 0.1,-0.4 0.4,-0.4 0.4,0.4 ; 0.1,0.4 0.25,0 0.4,0.4 ; 0.6,0.4 0.9,0.4 ; 0.6,0.4 0.6,-0.4 0.9,-0.4 0.9,0.4 ; 0.6,0.4 0.75,0 0.9,0.4 ; 1.1,0.4 1.4,0.4 ; 1.1,0.4 1.1,-0.4 1.4,-0.4 1.4,0.4 ; 1.1,0.4 1.25,0 1.4,0.4 ; 1.6,0.4 1.9,0.4 ; 1.6,0.4 1.6,-0.4 1.9,-0.4 1.9,0.4 ; 1.6,0.4 1.75,0 1.9,0.4 ; 2.1,0.4 2.4,0.4 ; 2.1,0.4 2.1,-0.4 2.4,-0.4 2.4,0.4 ; 2.1,0.4 2.25,0 2.4,0.4 ; 3.5,-3.45 4.7,-1.925 5.9,-0.4 ; 3.5,-3.45 4.8,-3.45 4.8,-2.6 ; 3.5,-3.45 3.5,-0.4 ; 3.5,-0.4 5.9,-0.4 ; 4.8,-2.6 5.35,-1.5 5.9,-2.6 ; 4.8,-2.6 5.9,-2.6 ; 5.9,-2.6 5.9,-0.4 ; -3.4,-2.34 -2.7,-2.34 -2.7,-1 -3.4,-1 -3.4,-2.34 ; 2.7,-2.34 3.4,-2.34 3.4,-1 2.7,-1 2.7,-2.34
Mechanical 14:
  circle w0.25: c-2.975,0.4 r0.125
  lines w0.1: -4.85,-6.3 -4.564,-5.8 -4.275,-6.3 ; -4.65,-1.8 -5.35,-1.8 -5.35,-1.6 -4.85,-1.6 -4.85,-1.3 -5.35,-1.3 -5.35,-1.1 -4.85,-1.1 -4.85,-0.9 -4.65,-0.9 ; -3.975,-5.5 -3.975,-4.1 ; -3.975,-4.7 -4.125,-4.613 -4.125,-4.387 -3.975,-4.3 ; -3.815,-5.5 -3.815,-4.1 ; -3.325,-5.5 -3.325,-4.426 -3.075,-4.426 ; -3.075,-5.5 -3.075,-4.426 ; -2.775,-4.216 cw(c-2.985,-4.216) -2.985,-4.426 -3.075,-4.426 ; -2.35,-0.593 -2.35,0.1 -2.15,0.1 -2.15,-0.593 ; -1.85,-0.593 -1.85,0.1 -1.65,0.1 -1.65,-0.593 ; -1.35,-0.593 -1.35,0.1 -1.15,0.1 -1.15,-0.593 ; -0.85,-0.593 -0.85,0.1 -0.65,0.1 -0.65,-0.593 ; -0.35,-0.593 -0.35,0.1 -0.15,0.1 -0.15,-0.593 ; 0.15,-0.593 0.15,0.1 0.35,0.1 0.35,-0.593 ; 0.65,-0.593 0.65,0.1 0.85,0.1 0.85,-0.593 ; 1.15,-0.593 1.15,0.1 1.35,0.1 1.35,-0.593 ; 1.65,-0.593 1.65,0.1 1.85,0.1 1.85,-0.593 ; 2.15,-0.593 2.15,0.1 2.35,0.1 2.35,-0.593 ; 2.775,-4.216 ccw(c2.985,-4.216) 2.985,-4.426 3.325,-4.426 3.325,-5.5 ; 3.075,-5.5 3.075,-4.426 ; 3.815,-5.5 3.815,-4.1 ; 3.975,-5.5 3.975,-4.1 ; 3.975,-4.7 4.125,-4.613 4.125,-4.387 3.975,-4.3 ; 4.65,-1.8 5.35,-1.8 5.35,-1.6 4.85,-1.6 4.85,-1.3 5.35,-1.3 5.35,-1.1 4.85,-1.1 4.85,-0.9 4.65,-0.9 ; -5.55,-6.1 ccw(c-5.35,-6.1) -5.35,-6.3 5.35,-6.3 ccw(c5.35,-6.1) 5.55,-6.1 5.55,-5.5 2.825,-5.5 2.825,-6.05 -2.825,-6.05 -2.825,-5.5 -5.55,-5.5 -5.55,-6.1 ; -4.65,-4.1 -4.65,-0.6 4.65,-0.6 4.65,-4.1 3.775,-4.1 3.775,-1.225 ccw(c3.65,-1.225) 3.525,-1.225 3.525,-4.1 2.775,-4.1 2.775,-4.8 2.675,-4.9 -2.675,-4.9 -2.775,-4.8 -2.775,-4.1 -3.525,-4.1 -3.525,-1.225 ccw(c-3.65,-1.225) -3.775,-1.225 -3.775,-4.1 -4.65,-4.1
Mechanical 15:
  lines w0.05: -6.15,-2.85 -6.15,-0.15 -2.65,-0.15 -2.65,0.65 2.65,0.65 2.65,-0.15 6.15,-0.15 6.15,-2.85 5.8,-2.85 5.8,-6.55 -5.8,-6.55 -5.8,-2.85 -6.15,-2.85
3D body "MOLEX_52745-1097.stp": height 2, standoff 0, extent -5.55,-6.3 5.55,0.1

## MOLEX_71430-0013 [mm]
pads (72):
  round 1.05 hole 0.65: 1(-13.005,-1.75) 2(-12.205,-0.6) 3(-11.405,-1.75) 4(-10.605,-0.6) 5(-9.805,-1.75) 6(-9.005,-0.6) 7(-8.205,-1.75) 8(-7.405,-0.6) 9(-6.605,-1.75) 10(-5.805,-0.6) 11(-5.005,-1.75) 12(-4.205,-0.6) 13(-3.405,-1.75) 14(-2.605,-0.6) 15(-1.805,-1.75) 16(-1.005,-0.6) 17(-0.205,-1.75) 18(0.595,-0.6) 19(1.395,-1.75) 20(2.195,-0.6) 21(2.995,-1.75) 22(3.795,-0.6) 23(4.595,-1.75) 24(5.395,-0.6) 25(6.195,-1.75) 26(6.995,-0.6) 27(7.795,-1.75) 28(8.595,-0.6) 29(9.395,-1.75) 30(10.195,-0.6) 31(10.995,-1.75) 32(11.795,-0.6) 33(12.595,-1.75) 34(13.395,-0.6) 35(-13.405,0.6) 36(-12.605,1.75) 37(-11.805,0.6) 38(-11.005,1.75) 39(-10.205,0.6) 40(-9.405,1.75) 41(-8.605,0.6) 42(-7.805,1.75) 43(-7.005,0.6) 44(-6.205,1.75) 45(-5.405,0.6) 46(-4.605,1.75) 47(-3.805,0.6) 48(-3.005,1.75) 49(-2.205,0.6) 50(-1.405,1.75) 51(-0.605,0.6) 52(0.195,1.75) 53(0.995,0.6) 54(1.795,1.75) 55(2.595,0.6) 56(3.395,1.75) 57(4.195,0.6) 58(4.995,1.75) 59(5.795,0.6) 60(6.595,1.75) 61(7.395,0.6) 62(8.195,1.75) 63(8.995,0.6) 64(9.795,1.75) 65(10.595,0.6) 66(11.395,1.75) 67(12.195,0.6) 68(12.995,1.75)
  round 2.25 hole 1.2: 69(-16.175,0.5) 70(16.175,0.5)
  round 1 hole 1.75 unplated mask+0.375: 71(-20.95,3.13) 72(20.95,3.13)
Top Overlay:
  circle w0.2: c18.75,0.4 r0.4
  circle w0.2: c-18.75,0.4 r0.4
  lines w0.2: -21.35,1.919 -21.35,-2.4 -13.591,-2.4 ; -21.35,4.341 -21.35,7.131 21.35,7.131 21.35,4.341 ; -21.35,4.6 -16.15,4.6 -16.15,2.025 ; -21.35,6.8 21.35,6.8 ; -20.55,-2.4 -20.55,1.919 ; -19.765,3.6 -17.05,3.6 -17.05,1.749 ; -17.05,-2.4 -17.05,-0.749 ; -16.15,-2.4 -16.15,-1.025 ; -15.796,7.131 -15.796,12.05 cw(c-15.596,12.05) -15.596,12.25 15.596,12.25 cw(c15.596,12.05) 15.796,12.05 15.796,7.131 ; -15,-2.4 -15,-0.472 ; -15,1.472 -15,4.6 15,4.6 15,1.472 ; -14.653,0.6 -14.28,0.6 ; -14,-2.4 -14,-0.042 ; -13,4.6 -13,6.798 ; -9,4.6 -8.995,6.8 ; -2,4.6 -2,6.798 ; 2,4.6 2,6.798 ; 9,4.6 9,6.798 ; 13,4.6 13,6.798 ; 13.181,-2.4 21.35,-2.4 21.35,1.919 ; 14,-2.4 14,-1.232 ; 14,0.032 14,0.6 14.653,0.6 ; 15,-2.4 15,-0.472 ; 16.15,-2.4 16.15,-1.025 ; 16.15,2.025 16.15,4.6 21.35,4.6 ; 17.05,-2.4 17.05,-0.749 ; 17.05,1.749 17.05,3.6 19.765,3.6 ; 20.55,-2.4 20.55,1.919 ; -12,4.85 -12,6.55 -10,6.55 -10,4.85 -12,4.85 ; -1,4.85 -1,6.55 1,6.55 1,4.85 -1,4.85 ; 10,4.85 10,6.55 12,6.55 12,4.85 10,4.85
  text "36" at -13.294,2.761 h1.2
  text "1" at -13.159,-4.073 h1.2
  text "68" at 12.306,2.761 h1.2
  text "33" at 11.62,-4.071 h1.2
Mechanical 8:
  drawing of 298 lines, arcs and shapes, not listed
  text "EDGE OF PCB" at -4.017,7.222 h1
Mechanical 14:
  drawing of 251 lines, arcs and shapes, not listed
  text "1" at -13.159,-4.073 h1.2
  text "33" at 11.62,-4.071 h1.2
3D body "MOLEX_71430-0013.stp": height 6.28, standoff -2.48, extent -21.35,-2.4 21.35,12.25

## MOLEX_502570-0893 [mm]
pads (14):
  rect 0.8x1.5 smd: 1(-3.85,0) 2(-2.75,0) 3(-1.65,0) 4(-0.55,0) 5(0.55,0) 6(1.65,0) 7(2.75,0) 8(3.85,0)
  rect 1.4x1.7 smd: 9(-7.6,2.9) 10(5.3,2.9)
  rect 1.5x1.15 smd: 11(-4.05,-11.575) 12(-1.75,-11.575) 13(4.85,-11.575)
  rect 1.15x1.5 smd: 14(5.425,-6.85)
Top Layer keep-out:
  lines w0.1: -0.8,-11.687 0.2,-11.687 0.2,-11.2 -0.8,-11.2 -0.8,-11.687 ; 2.85,-10.8 5.75,-10.8 5.75,-9.4 2.85,-9.4 2.85,-10.8 ; 5.05,-5.9 5.05,-4.9 5.55,-4.9 5.55,-5.9 5.05,-5.9
Top Overlay:
  circle w0.25: c-3.975,2.925 r0.125
  lines w0.2: -8.05,1.65 -8.05,-11.9 -5.2,-11.9 ; -7.2,1.65 -7.2,-1.2 ccw(c-7.1,-1.2) -7.1,-1.3 -7,-1.3 ccw(c-7,-1.2) -6.9,-1.2 -6.9,1.65 ; -6.5,1.7 -6.45,1.7 cw(c-6.45,1.65) -6.4,1.65 -6.4,-1.2 ccw(c-6.3,-1.2) -6.3,-1.3 -6.2,-1.3 ccw(c-6.2,-1.2) -6.1,-1.2 -6.1,1.85 ccw(c-6.25,1.85) -6.25,2 -6.5,2 ; -6.5,3.6 -4.69,3.6 -4.69,2.323 ; -6.24,3.25 -6.29,3.25 -6.29,3.6 -6.24,3.55 -6.24,2.658 ccw(c-6.14,2.658) -6.158,2.56 ccw(c-0.65,32.05) 4.2,2.445 ; -6.21,3.22 -5.36,3.22 ; -6.21,3.6 -6.21,3.07 -5.71,3.07 -5.61,2.97 -5.36,2.97 -5.36,3.6 ; -6.01,3.07 cw(c-6.01,2.87) -5.81,2.87 -5.81,2.497 ; -5.81,2.702 -5.661,2.577 cw(c-5.79,2.424) -5.593,2.46 ; -5.79,-10.4 -4.99,-10.4 ; -4.99,-10.5 -4.99,-9.169 -6.034,-9.169 -5.79,-10.291 -5.79,-10.5 cw(c-5.94,-10.5) -5.94,-10.65 -6.57,-10.65 cw(c-6.57,-10.5) -6.72,-10.5 -6.72,-6.25 cw(c-6.57,-6.25) -6.57,-6.1 -6.035,-6.1 ccw(c-6.035,-5.95) -5.885,-5.95 -5.885,-5.55 cw(c-5.735,-5.55) -5.735,-5.4 -5.09,-5.4 cw(c-5.09,-5.9) -4.59,-5.9 -4.59,-10.5 ; -4.69,2.35 -4.39,2.35 -4.39,2.284 ; -4.2,-1.15 -4.2,-2 ccw(c-3.2,-2) -3.2,-3 -1.25,-3 ccw(c-1.25,-2) -0.25,-2 -0.25,-1.15 ; 0.25,-1.15 0.25,-2 ccw(c1.25,-2) 1.25,-3 3.2,-3 ccw(c3.2,-2) 4.2,-2 4.2,-1.15 ; 0.6,-11.9 3.7,-11.9 ; 4.473,-8 ccw(c4.56,-8.05) 4.46,-8.05 4.46,-8.55 ccw(c4.56,-8.55) 4.56,-8.65 5.75,-8.65 ; 5.06,-8.648 5.06,-8 ; 5.18,-4.5 5.18,-2.85 cw(c5.28,-2.85) 5.28,-2.75 5.75,-2.75 ; 5.18,-3.53 5.6,-3.53 ; 5.18,-3.35 5.6,-3.35 ; 5.18,-3.2 5.6,-3.2 ; 5.18,-3.18 5.5,-3.18 ccw(c5.5,-2.93) 5.75,-2.93 ; 5.18,-3.03 5.5,-3.03 ccw(c5.5,-2.93) 5.6,-2.93 ; 5.18,-3.01 5.41,-3.01 5.6,-2.82 ; 5.18,-2.91 5.51,-2.91 ; 5.37,-4.5 5.37,-3.53 ; 5.37,-4.35 5.6,-4.35 ; 5.37,-3.75 5.6,-3.75 ; 5.41,-8.65 5.41,-8 ; 5.47,-4.5 5.47,-4.35 ; 5.47,-3.75 5.47,-3.53 ; 5.6,-8.641 5.6,-8 ; 5.6,-4.5 5.6,-2.75 ; 5.6,-3.4 5.75,-3.399 ; 5.75,-9 5.75,-8 ; 5.75,-4.5 5.75,1.65 ; -7.5,-5.55 ccw(c-7.35,-5.55) -7.35,-5.7 -6.55,-5.7 ccw(c-6.55,-5.55) -6.4,-5.55 -6.4,-3.4 ccw(c-6.5,-3.4) -6.5,-3.3 -6.6,-3.3 ccw(c-6.6,-3.4) -6.7,-3.4 -6.7,-5.25 cw(c-6.75,-5.25) -6.75,-5.3 -7.15,-5.3 cw(c-7.15,-5.25) -7.2,-5.25 -7.2,-3.4 ccw(c-7.3,-3.4) -7.3,-3.3 -7.4,-3.3 ccw(c-7.4,-3.4) -7.5,-3.4 -7.5,-5.55
Mechanical 8:
  lines w0.1: -8.1,2.9 -7.6,2.9 ; -7.6,2.4 -7.6,2.9 ; -7.6,3.4 -7.6,2.9 ; -7.1,2.9 -7.6,2.9 ; -4.55,-11.575 -4.05,-11.575 ; -4.35,0 -3.85,0 ; -4.05,-12.075 -4.05,-11.575 ; -4.05,-11.075 -4.05,-11.575 ; -3.85,-0.5 -3.85,0 ; -3.85,0.5 -3.85,0 ; -3.55,-11.575 -4.05,-11.575 ; -3.35,0 -3.85,0 ; -3.25,0 -2.75,0 ; -2.75,-0.5 -2.75,0 ; -2.75,0.5 -2.75,0 ; -2.25,-11.575 -1.75,-11.575 ; -2.25,0 -2.75,0 ; -2.15,0 -1.65,0 ; -1.75,-12.075 -1.75,-11.575 ; -1.75,-11.075 -1.75,-11.575 ; -1.65,-0.5 -1.65,0 ; -1.65,0.5 -1.65,0 ; -1.25,-11.575 -1.75,-11.575 ; -1.15,0 -1.65,0 ; -1.05,0 -0.55,0 ; -0.55,-0.5 -0.55,0 ; -0.55,0.5 -0.55,0 ; -0.354,-0.354 0,0 ; -0.354,0.354 0,0 ; -0.05,0 -0.55,0 ; 0.05,0 0.55,0 ; 0.354,-0.354 0,0 ; 0.354,0.354 0,0 ; 0.55,-0.5 0.55,0 ; 0.55,0.5 0.55,0 ; 1.05,0 0.55,0 ; 1.15,0 1.65,0 ; 1.65,-0.5 1.65,0 ; 1.65,0.5 1.65,0 ; 2.15,0 1.65,0 ; 2.25,0 2.75,0 ; 2.75,-0.5 2.75,0 ; 2.75,0.5 2.75,0 ; 3.25,0 2.75,0 ; 3.35,0 3.85,0 ; 3.85,-0.5 3.85,0 ; 3.85,0.5 3.85,0 ; 4.35,-11.575 4.85,-11.575 ; 4.35,0 3.85,0 ; 4.8,2.9 5.3,2.9 ; 4.85,-12.075 4.85,-11.575 ; 4.85,-11.075 4.85,-11.575 ; 4.925,-6.85 5.425,-6.85 ; 5.3,2.4 5.3,2.9 ; 5.3,3.4 5.3,2.9 ; 5.35,-11.575 4.85,-11.575 ; 5.425,-7.35 5.425,-6.85 ; 5.425,-6.35 5.425,-6.85 ; 5.8,2.9 5.3,2.9 ; 5.925,-6.85 5.425,-6.85 ; -0.8,-11.7 -0.8,-11.2 ; -0.8,-11.7 0.2,-11.7 ; -0.8,-11.7 -0.3,-11.45 ; -0.8,-11.2 0.2,-11.2 ; -0.8,-11.2 -0.3,-11.45 ; -0.3,-11.45 0.2,-11.2 ; -0.3,-11.45 0.2,-11.7 ; 0.2,-11.7 0.2,-11.2 ; 2.85,-10.8 5.75,-10.8 ; 2.85,-10.8 2.85,-9.4 ; 2.85,-10.8 4.3,-10.1 ; 2.85,-9.4 5.75,-9.4 ; 2.85,-9.4 4.3,-10.1 ; 4.3,-10.1 5.75,-9.4 ; 4.3,-10.1 5.75,-10.8 ; 5.05,-5.9 5.05,-4.9 ; 5.05,-5.9 5.55,-5.9 ; 5.05,-5.9 5.3,-5.4 ; 5.05,-4.9 5.55,-4.9 ; 5.05,-4.9 5.3,-5.4 ; 5.3,-5.4 5.55,-4.9 ; 5.3,-5.4 5.55,-5.9 ; 5.55,-5.9 5.55,-4.9 ; 5.75,-10.8 5.75,-9.4 ; -8.3,2.05 -6.9,2.05 -6.9,3.75 -8.3,3.75 -8.3,2.05 ; -4.8,-12.15 -3.3,-12.15 -3.3,-11 -4.8,-11 -4.8,-12.15 ; -4.25,-0.75 -3.45,-0.75 -3.45,0.75 -4.25,0.75 -4.25,-0.75 ; -3.15,-0.75 -2.35,-0.75 -2.35,0.75 -3.15,0.75 -3.15,-0.75 ; -2.5,-12.15 -2.5,-11 -1,-11 -1,-12.15 -2.5,-12.15 ; -2.05,-0.75 -1.25,-0.75 -1.25,0.75 -2.05,0.75 -2.05,-0.75 ; -0.95,-0.75 -0.15,-0.75 -0.15,0.75 -0.95,0.75 -0.95,-0.75 ; 0.15,-0.75 0.95,-0.75 0.95,0.75 0.15,0.75 0.15,-0.75 ; 1.25,-0.75 2.05,-0.75 2.05,0.75 1.25,0.75 1.25,-0.75 ; 2.35,-0.75 3.15,-0.75 3.15,0.75 2.35,0.75 2.35,-0.75 ; 3.45,-0.75 4.25,-0.75 4.25,0.75 3.45,0.75 3.45,-0.75 ; 4.1,-12.15 4.1,-11 5.6,-11 5.6,-12.15 4.1,-12.15 ; 4.6,2.05 6,2.05 6,3.75 4.6,3.75 4.6,2.05 ; 4.85,-7.6 6,-7.6 6,-6.1 4.85,-6.1 4.85,-7.6
Mechanical 14:
  drawing of 210 lines, arcs and shapes, not listed
Mechanical 15:
  lines w0.05: -8.55,-12.4 6.25,-12.4 6.25,4 -8.55,4 -8.55,-12.4
3D body "MOLEX_502570-0893.stp": height 1.8, standoff 0, extent -8.05,-11.9 5.75,3.6